# Altium footprint library GBA.PcbLib: 115 footprints (part 8 of 8)
Each footprint in its own frame and in the unit in brackets; x right, y up, seen from the top. Pads: shape width x height; smd on the part's side, far side on the other; paste and mask are expansions set on the pad; w line width, h text height; cw(c..) or ccw(c..) is an arc to the next point about the centre after c.
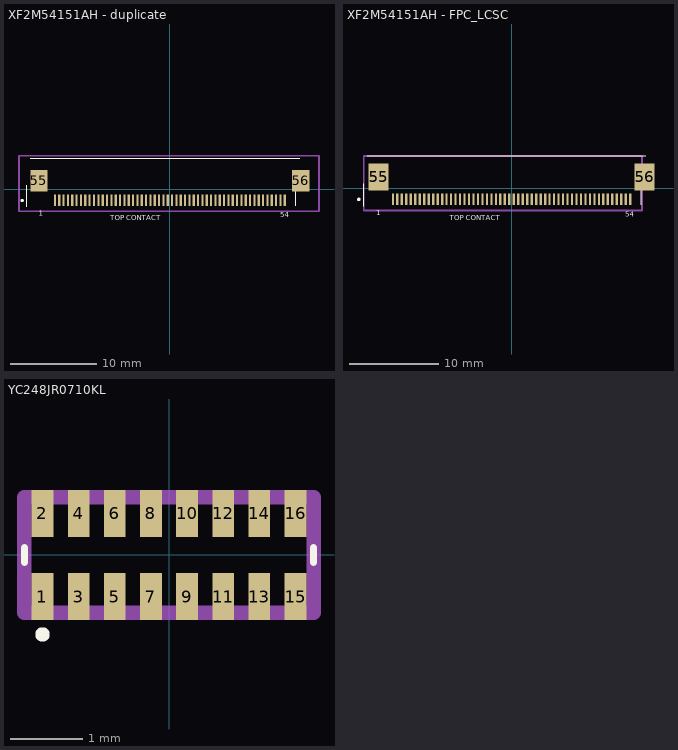
[diagram p7: the footprints below, top view; thin cyan lines are the x and y axes]

## XF2M54151AH - duplicate [mm]
pads (56):
  rect 0.25x1.3 smd: 1(-13.25,-1.25) 2(-12.75,-1.25) 3(-12.25,-1.25) 4(-11.75,-1.25) 5(-11.25,-1.25) 6(-10.75,-1.25) 7(-10.25,-1.25) 8(-9.75,-1.25) 9(-9.25,-1.25) 10(-8.75,-1.25) 11(-8.25,-1.25) 12(-7.75,-1.25) 13(-7.25,-1.25) 14(-6.75,-1.25) 15(-6.25,-1.25) 16(-5.75,-1.25) 17(-5.25,-1.25) 18(-4.75,-1.25) 19(-4.25,-1.25) 20(-3.75,-1.25) 21(-3.25,-1.25) 22(-2.75,-1.25) 23(-2.25,-1.25) 24(-1.75,-1.25) 25(-1.25,-1.25) 26(-0.75,-1.25) 27(-0.25,-1.25) 28(0.25,-1.25) 29(0.75,-1.25) 30(1.25,-1.25) 31(1.75,-1.25) 32(2.25,-1.25) 33(2.75,-1.25) 34(3.25,-1.25) 35(3.75,-1.25) 36(4.25,-1.25) 37(4.75,-1.25) 38(5.25,-1.25) 39(5.75,-1.25) 40(6.25,-1.25) 41(6.75,-1.25) 42(7.25,-1.25) 43(7.75,-1.25) 44(8.25,-1.25) 45(8.75,-1.25) 46(9.25,-1.25) 47(9.75,-1.25) 48(10.25,-1.25) 49(10.75,-1.25) 50(11.25,-1.25) 51(11.75,-1.25) 52(12.25,-1.25) 53(12.75,-1.25) 54(13.25,-1.25)
  rect 2x2.5 smd: 55(-15.1,1) 56(15.1,1)
Top Overlay:
  lines w0.1: -16.494,-2.009 -16.494,0.491 ; -16.113,3.579 14.987,3.579 ; 14.494,-1.882 14.494,0.618
  lines w0.2: -17.145,-1.27 cw(c-17.045,-1.27) -16.945,-1.27 cw(c-17.045,-1.27) -17.042,-1.17
  text "54" at 12.716,-3.406 h1
  text "1" at -15.097,-3.279 h1
  text "TOP CONTACT" at -6.884,-3.79 h1
Mechanical 13:
  lines w0.2: -17.4,-2.517 17.2,-2.517 17.2,3.9 -17.4,3.9 -17.4,-2.517
Top Designator (Mech29):
  text ".Designator" at -6.969,0.404 h1
3D body "f32q_54pin_asm.stp": height 2.1, standoff 0.05, extent -17.15,-1.55 17.15,3.95

## XF2M54151AH - FPC_LCSC [mm]
pads (56):
  rect 0.25x1.3 smd: 1(-13.25,-1.25) 2(-12.75,-1.25) 3(-12.25,-1.25) 4(-11.75,-1.25) 5(-11.25,-1.25) 6(-10.75,-1.25) 7(-10.25,-1.25) 8(-9.75,-1.25) 9(-9.25,-1.25) 10(-8.75,-1.25) 11(-8.25,-1.25) 12(-7.75,-1.25) 13(-7.25,-1.25) 14(-6.75,-1.25) 15(-6.25,-1.25) 16(-5.75,-1.25) 17(-5.25,-1.25) 18(-4.75,-1.25) 19(-4.25,-1.25) 20(-3.75,-1.25) 21(-3.25,-1.25) 22(-2.75,-1.25) 23(-2.25,-1.25) 24(-1.75,-1.25) 25(-1.25,-1.25) 26(-0.75,-1.25) 27(-0.25,-1.25) 28(0.25,-1.25) 29(0.75,-1.25) 30(1.25,-1.25) 31(1.75,-1.25) 32(2.25,-1.25) 33(2.75,-1.25) 34(3.25,-1.25) 35(3.75,-1.25) 36(4.25,-1.25) 37(4.75,-1.25) 38(5.25,-1.25) 39(5.75,-1.25) 40(6.25,-1.25) 41(6.75,-1.25) 42(7.25,-1.25) 43(7.75,-1.25) 44(8.25,-1.25) 45(8.75,-1.25) 46(9.25,-1.25) 47(9.75,-1.25) 48(10.25,-1.25) 49(10.75,-1.25) 50(11.25,-1.25) 51(11.75,-1.25) 52(12.25,-1.25) 53(12.75,-1.25) 54(13.25,-1.25)
  rect 2.2x3 smd: 55(-14.85,1.25) 56(14.85,1.25)
Top Overlay:
  lines w0.1: -16.494,-2.009 -16.494,0.491 ; -16.113,3.579 14.987,3.579 ; 14.494,-1.882 14.494,0.618
  lines w0.2: -17.145,-1.27 cw(c-17.045,-1.27) -16.945,-1.27 cw(c-17.045,-1.27) -17.042,-1.17
  text "TOP CONTACT" at -6.884,-3.79 h1
  text "1" at -15.097,-3.279 h1
  text "54" at 12.716,-3.406 h1
Mechanical 13:
  lines w0.2: -16.494,-2.517 -16.494,3.579 14.55,3.579 14.55,-2.517 -16.494,-2.517
Top Designator (Mech29):
  text ".Designator" at -6.969,0.404 h1
3D body "XF2M_5415_1AH.STEP": height 2.1, standoff 0, extent -15.605,-2.569 15.495,3.631

## YC248JR0710KL [mm]
pads (16):
  rect 0.3x0.65 smd: 1(-1.75,-0.575) 2(-1.75,0.575) 3(-1.25,-0.575) 4(-1.25,0.575) 5(-0.75,-0.575) 6(-0.75,0.575) 7(-0.25,-0.575) 8(-0.25,0.575) 9(0.25,-0.575) 10(0.25,0.575) 11(0.75,-0.575) 12(0.75,0.575) 13(1.25,-0.575) 14(1.25,0.575) 15(1.75,-0.575) 16(1.75,0.575)
Top Overlay:
  lines w0.1: -2,-0.1 -2,0.1 ; 2,-0.1 2,0.1 ; -1.8,-1.1 cw(c-1.75,-1.1) -1.7,-1.1 cw(c-1.75,-1.1) -1.8,-1.1
Top Designator:
  lines w0.2: -2,-0.8 -2,0.8 2,0.8 2,-0.8 -2,-0.8
  text ".Designator" at -1.651,-0.508 h1
3D body "YC248-JR-070RL.stp": height 0.65, standoff 0, extent -2,-0.87 2,0.87